# Altium footprint library IC_SMD_BGA.PCBLIB: 101 footprints (part 12 of 13)
Each footprint in its own frame and in the unit in brackets; x right, y up, seen from the top. Pads: shape width x height; smd on the part's side, far side on the other; paste and mask are expansions set on the pad; w line width, h text height; cw(c..) or ccw(c..) is an arc to the next point about the centre after c.
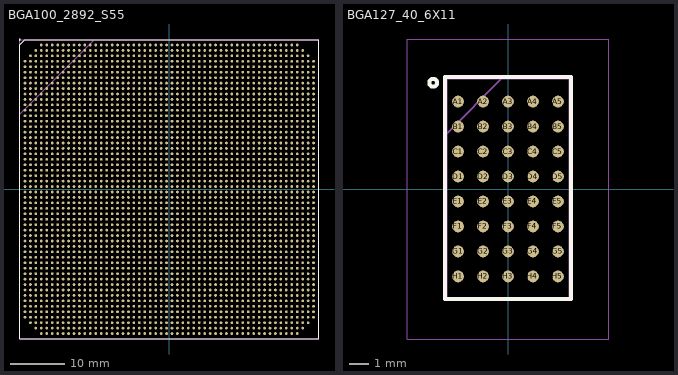
[diagram p11: the footprints below, top view; thin cyan lines are the x and y axes]

## BGA100_2892_S55 [mm] "BGA, 2892-Leads, Body 55x55mmx4.30mm, Pitch 1.00mm"
pads (2892):
  round 0.5 smd: A4(-23.5,26.5) A5(-22.5,26.5) A6(-21.5,26.5) A7(-20.5,26.5) A8(-19.5,26.5) A9(-18.5,26.5) A10(-17.5,26.5) A11(-16.5,26.5) A12(-15.5,26.5) A13(-14.5,26.5) A14(-13.5,26.5) A15(-12.5,26.5) A16(-11.5,26.5) A17(-10.5,26.5) A18(-9.5,26.5) A19(-8.5,26.5) A20(-7.5,26.5) A21(-6.5,26.5) A22(-5.5,26.5) A23(-4.5,26.5) A24(-3.5,26.5) A25(-2.5,26.5) A26(-1.5,26.5) A27(-0.5,26.5) A28(0.5,26.5) A29(1.5,26.5) A30(2.5,26.5) A31(3.5,26.5) A32(4.5,26.5) A33(5.5,26.5) A34(6.5,26.5) A35(7.5,26.5) A36(8.5,26.5) A37(9.5,26.5) A38(10.5,26.5) A39(11.5,26.5) A40(12.5,26.5) A41(13.5,26.5) A42(14.5,26.5) A43(15.5,26.5) A44(16.5,26.5) A45(17.5,26.5) A46(18.5,26.5) A47(19.5,26.5) A48(20.5,26.5) A49(21.5,26.5) A50(22.5,26.5) A51(23.5,26.5) AA1(-26.5,6.5) AA2(-25.5,6.5) AA3(-24.5,6.5) AA4(-23.5,6.5) AA5(-22.5,6.5) AA6(-21.5,6.5) AA7(-20.5,6.5) AA8(-19.5,6.5) AA9(-18.5,6.5) AA10(-17.5,6.5) AA11(-16.5,6.5) AA12(-15.5,6.5) AA13(-14.5,6.5) AA14(-13.5,6.5) AA15(-12.5,6.5) AA16(-11.5,6.5) AA17(-10.5,6.5) AA18(-9.5,6.5) AA19(-8.5,6.5) AA20(-7.5,6.5) AA21(-6.5,6.5) AA22(-5.5,6.5) AA23(-4.5,6.5) AA24(-3.5,6.5) AA25(-2.5,6.5) AA26(-1.5,6.5) AA27(-0.5,6.5) AA28(0.5,6.5) AA29(1.5,6.5) AA30(2.5,6.5) AA31(3.5,6.5) AA32(4.5,6.5) AA33(5.5,6.5) AA34(6.5,6.5) AA35(7.5,6.5) AA36(8.5,6.5) AA37(9.5,6.5) AA38(10.5,6.5) AA39(11.5,6.5) AA40(12.5,6.5) AA41(13.5,6.5) AA42(14.5,6.5) AA43(15.5,6.5) AA44(16.5,6.5) AA45(17.5,6.5) AA46(18.5,6.5) AA47(19.5,6.5) AA48(20.5,6.5) AA49(21.5,6.5) AA50(22.5,6.5) AA51(23.5,6.5) AA52(24.5,6.5) AA53(25.5,6.5) AA54(26.5,6.5) AB1(-26.5,5.5) AB2(-25.5,5.5) AB3(-24.5,5.5) AB4(-23.5,5.5) AB5(-22.5,5.5) AB6(-21.5,5.5) AB7(-20.5,5.5) AB8(-19.5,5.5) AB9(-18.5,5.5) AB10(-17.5,5.5) AB11(-16.5,5.5) AB12(-15.5,5.5) AB13(-14.5,5.5) AB14(-13.5,5.5) AB15(-12.5,5.5) AB16(-11.5,5.5) AB17(-10.5,5.5) AB18(-9.5,5.5) AB19(-8.5,5.5) AB20(-7.5,5.5) AB21(-6.5,5.5) AB22(-5.5,5.5) AB23(-4.5,5.5) AB24(-3.5,5.5) AB25(-2.5,5.5) AB26(-1.5,5.5) AB27(-0.5,5.5) AB28(0.5,5.5) AB29(1.5,5.5) AB30(2.5,5.5) AB31(3.5,5.5) AB32(4.5,5.5) AB33(5.5,5.5) AB34(6.5,5.5) AB35(7.5,5.5) AB36(8.5,5.5) AB37(9.5,5.5) AB38(10.5,5.5) AB39(11.5,5.5) AB40(12.5,5.5) AB41(13.5,5.5) AB42(14.5,5.5) AB43(15.5,5.5) AB44(16.5,5.5) AB45(17.5,5.5) AB46(18.5,5.5) AB47(19.5,5.5) AB48(20.5,5.5) AB49(21.5,5.5) AB50(22.5,5.5) AB51(23.5,5.5) AB52(24.5,5.5) AB53(25.5,5.5) AB54(26.5,5.5) AC1(-26.5,4.5) AC2(-25.5,4.5) AC3(-24.5,4.5) AC4(-23.5,4.5) AC5(-22.5,4.5) AC6(-21.5,4.5) AC7(-20.5,4.5) AC8(-19.5,4.5) AC9(-18.5,4.5) AC10(-17.5,4.5) AC11(-16.5,4.5) AC12(-15.5,4.5) AC13(-14.5,4.5) AC14(-13.5,4.5) AC15(-12.5,4.5) AC16(-11.5,4.5) AC17(-10.5,4.5) AC18(-9.5,4.5) AC19(-8.5,4.5) AC20(-7.5,4.5) AC21(-6.5,4.5) AC22(-5.5,4.5) AC23(-4.5,4.5) AC24(-3.5,4.5) AC25(-2.5,4.5) AC26(-1.5,4.5) AC27(-0.5,4.5) AC28(0.5,4.5) AC29(1.5,4.5) AC30(2.5,4.5) AC31(3.5,4.5) AC32(4.5,4.5) AC33(5.5,4.5) AC34(6.5,4.5) AC35(7.5,4.5) AC36(8.5,4.5) AC37(9.5,4.5) AC38(10.5,4.5) AC39(11.5,4.5) AC40(12.5,4.5) AC41(13.5,4.5) AC42(14.5,4.5) AC43(15.5,4.5) AC44(16.5,4.5) AC45(17.5,4.5) AC46(18.5,4.5) AC47(19.5,4.5) AC48(20.5,4.5) AC49(21.5,4.5) AC50(22.5,4.5) AC51(23.5,4.5) AC52(24.5,4.5) AC53(25.5,4.5) AC54(26.5,4.5) AD1(-26.5,3.5) AD2(-25.5,3.5) AD3(-24.5,3.5) AD4(-23.5,3.5) AD5(-22.5,3.5) AD6(-21.5,3.5) AD7(-20.5,3.5) AD8(-19.5,3.5) AD9(-18.5,3.5) AD10(-17.5,3.5) AD11(-16.5,3.5) AD12(-15.5,3.5) AD13(-14.5,3.5) AD14(-13.5,3.5) AD15(-12.5,3.5) AD16(-11.5,3.5) AD17(-10.5,3.5) AD18(-9.5,3.5) AD19(-8.5,3.5) AD20(-7.5,3.5) AD21(-6.5,3.5) AD22(-5.5,3.5) AD23(-4.5,3.5) AD24(-3.5,3.5) AD25(-2.5,3.5) AD26(-1.5,3.5) AD27(-0.5,3.5) AD28(0.5,3.5) AD29(1.5,3.5) AD30(2.5,3.5) AD31(3.5,3.5) AD32(4.5,3.5) AD33(5.5,3.5) AD34(6.5,3.5) AD35(7.5,3.5) AD36(8.5,3.5) AD37(9.5,3.5) AD38(10.5,3.5) AD39(11.5,3.5) AD40(12.5,3.5) AD41(13.5,3.5) AD42(14.5,3.5) AD43(15.5,3.5) AD44(16.5,3.5) AD45(17.5,3.5) AD46(18.5,3.5) AD47(19.5,3.5) AD48(20.5,3.5) AD49(21.5,3.5) AD50(22.5,3.5) AD51(23.5,3.5) AD52(24.5,3.5) AD53(25.5,3.5) AD54(26.5,3.5) AE1(-26.5,2.5) AE2(-25.5,2.5) AE3(-24.5,2.5) AE4(-23.5,2.5) AE5(-22.5,2.5) AE6(-21.5,2.5) AE7(-20.5,2.5) AE8(-19.5,2.5) AE9(-18.5,2.5) AE10(-17.5,2.5) AE11(-16.5,2.5) AE12(-15.5,2.5) AE13(-14.5,2.5) AE14(-13.5,2.5) AE15(-12.5,2.5) AE16(-11.5,2.5) AE17(-10.5,2.5) AE18(-9.5,2.5) AE19(-8.5,2.5) AE20(-7.5,2.5) AE21(-6.5,2.5) AE22(-5.5,2.5) AE23(-4.5,2.5) AE24(-3.5,2.5) AE25(-2.5,2.5) AE26(-1.5,2.5) AE27(-0.5,2.5) AE28(0.5,2.5) AE29(1.5,2.5) AE30(2.5,2.5) AE31(3.5,2.5) AE32(4.5,2.5) AE33(5.5,2.5) AE34(6.5,2.5) AE35(7.5,2.5) AE36(8.5,2.5) AE37(9.5,2.5) AE38(10.5,2.5) AE39(11.5,2.5) AE40(12.5,2.5) AE41(13.5,2.5) AE42(14.5,2.5) AE43(15.5,2.5) AE44(16.5,2.5) AE45(17.5,2.5) AE46(18.5,2.5) AE47(19.5,2.5) AE48(20.5,2.5) AE49(21.5,2.5) AE50(22.5,2.5) AE51(23.5,2.5) AE52(24.5,2.5) AE53(25.5,2.5) AE54(26.5,2.5) AF1(-26.5,1.5) AF2(-25.5,1.5) AF3(-24.5,1.5) AF4(-23.5,1.5) AF5(-22.5,1.5) AF6(-21.5,1.5) AF7(-20.5,1.5) AF8(-19.5,1.5) AF9(-18.5,1.5) AF10(-17.5,1.5) AF11(-16.5,1.5) AF12(-15.5,1.5) AF13(-14.5,1.5) AF14(-13.5,1.5) AF15(-12.5,1.5) AF16(-11.5,1.5) AF17(-10.5,1.5) AF18(-9.5,1.5) AF19(-8.5,1.5) AF20(-7.5,1.5) AF21(-6.5,1.5) AF22(-5.5,1.5) AF23(-4.5,1.5) AF24(-3.5,1.5) AF25(-2.5,1.5) AF26(-1.5,1.5) AF27(-0.5,1.5) AF28(0.5,1.5) AF29(1.5,1.5) AF30(2.5,1.5) AF31(3.5,1.5) AF32(4.5,1.5) AF33(5.5,1.5) AF34(6.5,1.5) AF35(7.5,1.5) AF36(8.5,1.5) AF37(9.5,1.5) AF38(10.5,1.5) AF39(11.5,1.5) AF40(12.5,1.5) AF41(13.5,1.5) AF42(14.5,1.5) AF43(15.5,1.5) AF44(16.5,1.5) AF45(17.5,1.5) AF46(18.5,1.5) AF47(19.5,1.5) AF48(20.5,1.5) AF49(21.5,1.5) AF50(22.5,1.5) AF51(23.5,1.5) AF52(24.5,1.5) AF53(25.5,1.5) AF54(26.5,1.5) AG1(-26.5,0.5) AG2(-25.5,0.5) AG3(-24.5,0.5) AG4(-23.5,0.5) AG5(-22.5,0.5) AG6(-21.5,0.5) AG7(-20.5,0.5) AG8(-19.5,0.5) AG9(-18.5,0.5) AG10(-17.5,0.5) AG11(-16.5,0.5) AG12(-15.5,0.5) AG13(-14.5,0.5) AG14(-13.5,0.5) AG15(-12.5,0.5) AG16(-11.5,0.5) AG17(-10.5,0.5) AG18(-9.5,0.5) AG19(-8.5,0.5) AG20(-7.5,0.5) AG21(-6.5,0.5) AG22(-5.5,0.5) AG23(-4.5,0.5) AG24(-3.5,0.5) AG25(-2.5,0.5) AG26(-1.5,0.5) AG27(-0.5,0.5) AG28(0.5,0.5) AG29(1.5,0.5) AG30(2.5,0.5) AG31(3.5,0.5) AG32(4.5,0.5) AG33(5.5,0.5) AG34(6.5,0.5) AG35(7.5,0.5) AG36(8.5,0.5) AG37(9.5,0.5) AG38(10.5,0.5) AG39(11.5,0.5) AG40(12.5,0.5) AG41(13.5,0.5) AG42(14.5,0.5) AG43(15.5,0.5) AG44(16.5,0.5) AG45(17.5,0.5) AG46(18.5,0.5) AG47(19.5,0.5) AG48(20.5,0.5) AG49(21.5,0.5) AG50(22.5,0.5) AG51(23.5,0.5) AG52(24.5,0.5) AG53(25.5,0.5) AG54(26.5,0.5) AH1(-26.5,-0.5) AH2(-25.5,-0.5) AH3(-24.5,-0.5) AH4(-23.5,-0.5) AH5(-22.5,-0.5) AH6(-21.5,-0.5) AH7(-20.5,-0.5) AH8(-19.5,-0.5) AH9(-18.5,-0.5) AH10(-17.5,-0.5) AH11(-16.5,-0.5) AH12(-15.5,-0.5) AH13(-14.5,-0.5) AH14(-13.5,-0.5) AH15(-12.5,-0.5) AH16(-11.5,-0.5) AH17(-10.5,-0.5) AH18(-9.5,-0.5) AH19(-8.5,-0.5) AH20(-7.5,-0.5) AH21(-6.5,-0.5) AH22(-5.5,-0.5) AH23(-4.5,-0.5) AH24(-3.5,-0.5) AH25(-2.5,-0.5) AH26(-1.5,-0.5) AH27(-0.5,-0.5) AH28(0.5,-0.5) AH29(1.5,-0.5) AH30(2.5,-0.5) AH31(3.5,-0.5) AH32(4.5,-0.5) AH33(5.5,-0.5) AH34(6.5,-0.5) AH35(7.5,-0.5) AH36(8.5,-0.5) AH37(9.5,-0.5) AH38(10.5,-0.5) AH39(11.5,-0.5) AH40(12.5,-0.5) AH41(13.5,-0.5) AH42(14.5,-0.5) AH43(15.5,-0.5) AH44(16.5,-0.5) AH45(17.5,-0.5) AH46(18.5,-0.5) AH47(19.5,-0.5) AH48(20.5,-0.5) AH49(21.5,-0.5) AH50(22.5,-0.5) AH51(23.5,-0.5) AH52(24.5,-0.5) AH53(25.5,-0.5) AH54(26.5,-0.5) AJ1(-26.5,-1.5) AJ2(-25.5,-1.5) AJ3(-24.5,-1.5) AJ4(-23.5,-1.5) AJ5(-22.5,-1.5) AJ6(-21.5,-1.5) AJ7(-20.5,-1.5) AJ8(-19.5,-1.5) AJ9(-18.5,-1.5) AJ10(-17.5,-1.5) AJ11(-16.5,-1.5) AJ12(-15.5,-1.5) AJ13(-14.5,-1.5) AJ14(-13.5,-1.5) AJ15(-12.5,-1.5) AJ16(-11.5,-1.5) AJ17(-10.5,-1.5) AJ18(-9.5,-1.5) AJ19(-8.5,-1.5) AJ20(-7.5,-1.5) AJ21(-6.5,-1.5) AJ22(-5.5,-1.5) AJ23(-4.5,-1.5) AJ24(-3.5,-1.5) AJ25(-2.5,-1.5) AJ26(-1.5,-1.5) AJ27(-0.5,-1.5) AJ28(0.5,-1.5) AJ29(1.5,-1.5) AJ30(2.5,-1.5) AJ31(3.5,-1.5) AJ32(4.5,-1.5) AJ33(5.5,-1.5) AJ34(6.5,-1.5) AJ35(7.5,-1.5) AJ36(8.5,-1.5) AJ37(9.5,-1.5) AJ38(10.5,-1.5) AJ39(11.5,-1.5) AJ40(12.5,-1.5) AJ41(13.5,-1.5) AJ42(14.5,-1.5) AJ43(15.5,-1.5) AJ44(16.5,-1.5) AJ45(17.5,-1.5) AJ46(18.5,-1.5) AJ47(19.5,-1.5) AJ48(20.5,-1.5) AJ49(21.5,-1.5) AJ50(22.5,-1.5) AJ51(23.5,-1.5) AJ52(24.5,-1.5) AJ53(25.5,-1.5) AJ54(26.5,-1.5) AK1(-26.5,-2.5) AK2(-25.5,-2.5) AK3(-24.5,-2.5) AK4(-23.5,-2.5) AK5(-22.5,-2.5) AK6(-21.5,-2.5) AK7(-20.5,-2.5) AK8(-19.5,-2.5) AK9(-18.5,-2.5) AK10(-17.5,-2.5) AK11(-16.5,-2.5) AK12(-15.5,-2.5) AK13(-14.5,-2.5) AK14(-13.5,-2.5) AK15(-12.5,-2.5) AK16(-11.5,-2.5) AK17(-10.5,-2.5) AK18(-9.5,-2.5) AK19(-8.5,-2.5) AK20(-7.5,-2.5) AK21(-6.5,-2.5) AK22(-5.5,-2.5) AK23(-4.5,-2.5) AK24(-3.5,-2.5) AK25(-2.5,-2.5) AK26(-1.5,-2.5) AK27(-0.5,-2.5) AK28(0.5,-2.5) AK29(1.5,-2.5) AK30(2.5,-2.5) AK31(3.5,-2.5) AK32(4.5,-2.5) AK33(5.5,-2.5) AK34(6.5,-2.5) AK35(7.5,-2.5) AK36(8.5,-2.5) AK37(9.5,-2.5) AK38(10.5,-2.5) AK39(11.5,-2.5) AK40(12.5,-2.5) AK41(13.5,-2.5) AK42(14.5,-2.5) AK43(15.5,-2.5) AK44(16.5,-2.5) AK45(17.5,-2.5) AK46(18.5,-2.5) AK47(19.5,-2.5) AK48(20.5,-2.5) AK49(21.5,-2.5) AK50(22.5,-2.5) AK51(23.5,-2.5) AK52(24.5,-2.5) AK53(25.5,-2.5) AK54(26.5,-2.5) AL1(-26.5,-3.5) AL2(-25.5,-3.5) AL3(-24.5,-3.5) AL4(-23.5,-3.5) AL5(-22.5,-3.5) AL6(-21.5,-3.5) AL7(-20.5,-3.5) AL8(-19.5,-3.5) AL9(-18.5,-3.5) AL10(-17.5,-3.5) AL11(-16.5,-3.5) AL12(-15.5,-3.5) AL13(-14.5,-3.5) AL14(-13.5,-3.5) AL15(-12.5,-3.5) AL16(-11.5,-3.5) AL17(-10.5,-3.5) AL18(-9.5,-3.5) AL19(-8.5,-3.5) AL20(-7.5,-3.5) AL21(-6.5,-3.5) AL22(-5.5,-3.5) AL23(-4.5,-3.5) AL24(-3.5,-3.5) AL25(-2.5,-3.5) AL26(-1.5,-3.5) AL27(-0.5,-3.5) AL28(0.5,-3.5) AL29(1.5,-3.5) AL30(2.5,-3.5) AL31(3.5,-3.5) AL32(4.5,-3.5) AL33(5.5,-3.5) AL34(6.5,-3.5) AL35(7.5,-3.5) AL36(8.5,-3.5) AL37(9.5,-3.5) AL38(10.5,-3.5) AL39(11.5,-3.5) AL40(12.5,-3.5) AL41(13.5,-3.5) AL42(14.5,-3.5) AL43(15.5,-3.5) AL44(16.5,-3.5) AL45(17.5,-3.5) AL46(18.5,-3.5) AL47(19.5,-3.5) AL48(20.5,-3.5) AL49(21.5,-3.5) AL50(22.5,-3.5) AL51(23.5,-3.5) AL52(24.5,-3.5) AL53(25.5,-3.5) AL54(26.5,-3.5) AM1(-26.5,-4.5) AM2(-25.5,-4.5) AM3(-24.5,-4.5) AM4(-23.5,-4.5) AM5(-22.5,-4.5) AM6(-21.5,-4.5) AM7(-20.5,-4.5) AM8(-19.5,-4.5) AM9(-18.5,-4.5) AM10(-17.5,-4.5) AM11(-16.5,-4.5) AM12(-15.5,-4.5) AM13(-14.5,-4.5) AM14(-13.5,-4.5) AM15(-12.5,-4.5) AM16(-11.5,-4.5) AM17(-10.5,-4.5) AM18(-9.5,-4.5) AM19(-8.5,-4.5) AM20(-7.5,-4.5) AM21(-6.5,-4.5) AM22(-5.5,-4.5) AM23(-4.5,-4.5) AM24(-3.5,-4.5) AM25(-2.5,-4.5) AM26(-1.5,-4.5) AM27(-0.5,-4.5) AM28(0.5,-4.5) AM29(1.5,-4.5) AM30(2.5,-4.5) AM31(3.5,-4.5) AM32(4.5,-4.5) AM33(5.5,-4.5) AM34(6.5,-4.5) AM35(7.5,-4.5) AM36(8.5,-4.5) AM37(9.5,-4.5) AM38(10.5,-4.5) AM39(11.5,-4.5) AM40(12.5,-4.5) AM41(13.5,-4.5) AM42(14.5,-4.5) AM43(15.5,-4.5) AM44(16.5,-4.5) AM45(17.5,-4.5) AM46(18.5,-4.5) AM47(19.5,-4.5) AM48(20.5,-4.5) AM49(21.5,-4.5) AM50(22.5,-4.5) AM51(23.5,-4.5) AM52(24.5,-4.5) AM53(25.5,-4.5) AM54(26.5,-4.5) AN1(-26.5,-5.5) AN2(-25.5,-5.5) AN3(-24.5,-5.5) AN4(-23.5,-5.5) AN5(-22.5,-5.5) AN6(-21.5,-5.5) AN7(-20.5,-5.5) AN8(-19.5,-5.5) AN9(-18.5,-5.5) AN10(-17.5,-5.5) AN11(-16.5,-5.5) AN12(-15.5,-5.5) AN13(-14.5,-5.5) AN14(-13.5,-5.5) AN15(-12.5,-5.5) AN16(-11.5,-5.5) AN17(-10.5,-5.5) AN18(-9.5,-5.5) AN19(-8.5,-5.5) AN20(-7.5,-5.5) AN21(-6.5,-5.5) AN22(-5.5,-5.5) AN23(-4.5,-5.5) AN24(-3.5,-5.5) AN25(-2.5,-5.5) AN26(-1.5,-5.5) AN27(-0.5,-5.5) AN28(0.5,-5.5) AN29(1.5,-5.5) AN30(2.5,-5.5) AN31(3.5,-5.5) AN32(4.5,-5.5) AN33(5.5,-5.5) AN34(6.5,-5.5) AN35(7.5,-5.5) AN36(8.5,-5.5) AN37(9.5,-5.5) AN38(10.5,-5.5) AN39(11.5,-5.5) AN40(12.5,-5.5) AN41(13.5,-5.5) AN42(14.5,-5.5) AN43(15.5,-5.5) AN44(16.5,-5.5) AN45(17.5,-5.5) AN46(18.5,-5.5) AN47(19.5,-5.5) AN48(20.5,-5.5) AN49(21.5,-5.5) AN50(22.5,-5.5) AN51(23.5,-5.5) AN52(24.5,-5.5) AN53(25.5,-5.5) AN54(26.5,-5.5) AP1(-26.5,-6.5) AP2(-25.5,-6.5) AP3(-24.5,-6.5) AP4(-23.5,-6.5) AP5(-22.5,-6.5) AP6(-21.5,-6.5) AP7(-20.5,-6.5) AP8(-19.5,-6.5) AP9(-18.5,-6.5) AP10(-17.5,-6.5) AP11(-16.5,-6.5) AP12(-15.5,-6.5) AP13(-14.5,-6.5) AP14(-13.5,-6.5) AP15(-12.5,-6.5) AP16(-11.5,-6.5) AP17(-10.5,-6.5) AP18(-9.5,-6.5) AP19(-8.5,-6.5) AP20(-7.5,-6.5) AP21(-6.5,-6.5) AP22(-5.5,-6.5) AP23(-4.5,-6.5) AP24(-3.5,-6.5) AP25(-2.5,-6.5) AP26(-1.5,-6.5) AP27(-0.5,-6.5) AP28(0.5,-6.5) AP29(1.5,-6.5) AP30(2.5,-6.5) AP31(3.5,-6.5) AP32(4.5,-6.5) AP33(5.5,-6.5) AP34(6.5,-6.5) AP35(7.5,-6.5) AP36(8.5,-6.5) AP37(9.5,-6.5) AP38(10.5,-6.5) AP39(11.5,-6.5) AP40(12.5,-6.5) AP41(13.5,-6.5) AP42(14.5,-6.5) AP43(15.5,-6.5) AP44(16.5,-6.5) AP45(17.5,-6.5) AP46(18.5,-6.5) AP47(19.5,-6.5) AP48(20.5,-6.5) AP49(21.5,-6.5) AP50(22.5,-6.5) AP51(23.5,-6.5) AP52(24.5,-6.5) AP53(25.5,-6.5) AP54(26.5,-6.5) AR1(-26.5,-7.5) AR2(-25.5,-7.5) AR3(-24.5,-7.5) AR4(-23.5,-7.5) AR5(-22.5,-7.5) AR6(-21.5,-7.5) AR7(-20.5,-7.5) AR8(-19.5,-7.5) AR9(-18.5,-7.5) AR10(-17.5,-7.5) AR11(-16.5,-7.5) AR12(-15.5,-7.5) AR13(-14.5,-7.5) AR14(-13.5,-7.5) AR15(-12.5,-7.5) AR16(-11.5,-7.5) AR17(-10.5,-7.5) AR18(-9.5,-7.5) AR19(-8.5,-7.5) AR20(-7.5,-7.5) AR21(-6.5,-7.5) AR22(-5.5,-7.5) AR23(-4.5,-7.5) AR24(-3.5,-7.5) AR25(-2.5,-7.5) AR26(-1.5,-7.5) AR27(-0.5,-7.5) AR28(0.5,-7.5) AR29(1.5,-7.5) AR30(2.5,-7.5) AR31(3.5,-7.5) AR32(4.5,-7.5) AR33(5.5,-7.5) AR34(6.5,-7.5) AR35(7.5,-7.5) AR36(8.5,-7.5) AR37(9.5,-7.5) AR38(10.5,-7.5) AR39(11.5,-7.5) AR40(12.5,-7.5) AR41(13.5,-7.5) AR42(14.5,-7.5) AR43(15.5,-7.5) AR44(16.5,-7.5) AR45(17.5,-7.5) AR46(18.5,-7.5) AR47(19.5,-7.5) AR48(20.5,-7.5) AR49(21.5,-7.5) AR50(22.5,-7.5) AR51(23.5,-7.5) AR52(24.5,-7.5) AR53(25.5,-7.5) AR54(26.5,-7.5) AT1(-26.5,-8.5) AT2(-25.5,-8.5) AT3(-24.5,-8.5) AT4(-23.5,-8.5) AT5(-22.5,-8.5) AT6(-21.5,-8.5) AT7(-20.5,-8.5) AT8(-19.5,-8.5) AT9(-18.5,-8.5) AT10(-17.5,-8.5) AT11(-16.5,-8.5) AT12(-15.5,-8.5) AT13(-14.5,-8.5) AT14(-13.5,-8.5) AT15(-12.5,-8.5) AT16(-11.5,-8.5) AT17(-10.5,-8.5) AT18(-9.5,-8.5) AT19(-8.5,-8.5) AT20(-7.5,-8.5) AT21(-6.5,-8.5) AT22(-5.5,-8.5) AT23(-4.5,-8.5) AT24(-3.5,-8.5) AT25(-2.5,-8.5) AT26(-1.5,-8.5) AT27(-0.5,-8.5) AT28(0.5,-8.5) AT29(1.5,-8.5) AT30(2.5,-8.5) AT31(3.5,-8.5) AT32(4.5,-8.5) AT33(5.5,-8.5) AT34(6.5,-8.5) AT35(7.5,-8.5) AT36(8.5,-8.5) AT37(9.5,-8.5) AT38(10.5,-8.5) AT39(11.5,-8.5) AT40(12.5,-8.5) AT41(13.5,-8.5) AT42(14.5,-8.5) AT43(15.5,-8.5) AT44(16.5,-8.5) AT45(17.5,-8.5) AT46(18.5,-8.5) AT47(19.5,-8.5) AT48(20.5,-8.5) AT49(21.5,-8.5) AT50(22.5,-8.5) AT51(23.5,-8.5) AT52(24.5,-8.5) AT53(25.5,-8.5) AT54(26.5,-8.5) AU1(-26.5,-9.5) AU2(-25.5,-9.5) AU3(-24.5,-9.5) AU4(-23.5,-9.5) AU5(-22.5,-9.5) AU6(-21.5,-9.5) AU7(-20.5,-9.5) AU8(-19.5,-9.5) AU9(-18.5,-9.5) AU10(-17.5,-9.5) AU11(-16.5,-9.5) AU12(-15.5,-9.5) AU13(-14.5,-9.5) AU14(-13.5,-9.5) AU15(-12.5,-9.5) AU16(-11.5,-9.5) AU17(-10.5,-9.5) AU18(-9.5,-9.5) AU19(-8.5,-9.5) AU20(-7.5,-9.5) AU21(-6.5,-9.5) AU22(-5.5,-9.5) AU23(-4.5,-9.5) AU24(-3.5,-9.5) AU25(-2.5,-9.5) AU26(-1.5,-9.5) AU27(-0.5,-9.5) AU28(0.5,-9.5) AU29(1.5,-9.5) AU30(2.5,-9.5) AU31(3.5,-9.5) AU32(4.5,-9.5) AU33(5.5,-9.5) AU34(6.5,-9.5) AU35(7.5,-9.5) AU36(8.5,-9.5) AU37(9.5,-9.5) AU38(10.5,-9.5) AU39(11.5,-9.5) AU40(12.5,-9.5) AU41(13.5,-9.5) AU42(14.5,-9.5) AU43(15.5,-9.5) AU44(16.5,-9.5) AU45(17.5,-9.5) AU46(18.5,-9.5) AU47(19.5,-9.5) AU48(20.5,-9.5) AU49(21.5,-9.5) AU50(22.5,-9.5) AU51(23.5,-9.5) AU52(24.5,-9.5) AU53(25.5,-9.5) AU54(26.5,-9.5) AV1(-26.5,-10.5) AV2(-25.5,-10.5) AV3(-24.5,-10.5) AV4(-23.5,-10.5) AV5(-22.5,-10.5) AV6(-21.5,-10.5) AV7(-20.5,-10.5) AV8(-19.5,-10.5) AV9(-18.5,-10.5) AV10(-17.5,-10.5) AV11(-16.5,-10.5) AV12(-15.5,-10.5) AV13(-14.5,-10.5) AV14(-13.5,-10.5) AV15(-12.5,-10.5) AV16(-11.5,-10.5) AV17(-10.5,-10.5) AV18(-9.5,-10.5) AV19(-8.5,-10.5) AV20(-7.5,-10.5) AV21(-6.5,-10.5) AV22(-5.5,-10.5) AV23(-4.5,-10.5) AV24(-3.5,-10.5) AV25(-2.5,-10.5) AV26(-1.5,-10.5) AV27(-0.5,-10.5) AV28(0.5,-10.5) AV29(1.5,-10.5) AV30(2.5,-10.5) AV31(3.5,-10.5) AV32(4.5,-10.5) AV33(5.5,-10.5) AV34(6.5,-10.5) AV35(7.5,-10.5) AV36(8.5,-10.5) AV37(9.5,-10.5) AV38(10.5,-10.5) AV39(11.5,-10.5) AV40(12.5,-10.5) AV41(13.5,-10.5) AV42(14.5,-10.5) AV43(15.5,-10.5) AV44(16.5,-10.5) AV45(17.5,-10.5) AV46(18.5,-10.5) AV47(19.5,-10.5) AV48(20.5,-10.5) AV49(21.5,-10.5) AV50(22.5,-10.5) AV51(23.5,-10.5) AV52(24.5,-10.5) AV53(25.5,-10.5) AV54(26.5,-10.5) AW1(-26.5,-11.5) AW2(-25.5,-11.5) AW3(-24.5,-11.5) AW4(-23.5,-11.5) AW5(-22.5,-11.5) AW6(-21.5,-11.5) AW7(-20.5,-11.5) AW8(-19.5,-11.5) AW9(-18.5,-11.5) AW10(-17.5,-11.5) AW11(-16.5,-11.5) AW12(-15.5,-11.5) AW13(-14.5,-11.5) AW14(-13.5,-11.5) AW15(-12.5,-11.5) AW16(-11.5,-11.5) AW17(-10.5,-11.5) AW18(-9.5,-11.5) AW19(-8.5,-11.5) AW20(-7.5,-11.5) AW21(-6.5,-11.5) AW22(-5.5,-11.5) AW23(-4.5,-11.5) AW24(-3.5,-11.5) AW25(-2.5,-11.5) AW26(-1.5,-11.5) AW27(-0.5,-11.5) AW28(0.5,-11.5) AW29(1.5,-11.5) AW30(2.5,-11.5) AW31(3.5,-11.5) AW32(4.5,-11.5) AW33(5.5,-11.5) AW34(6.5,-11.5) AW35(7.5,-11.5) AW36(8.5,-11.5) AW37(9.5,-11.5) AW38(10.5,-11.5) AW39(11.5,-11.5) AW40(12.5,-11.5) AW41(13.5,-11.5) AW42(14.5,-11.5) AW43(15.5,-11.5) AW44(16.5,-11.5) AW45(17.5,-11.5) AW46(18.5,-11.5) AW47(19.5,-11.5) AW48(20.5,-11.5) AW49(21.5,-11.5) AW50(22.5,-11.5) AW51(23.5,-11.5) AW52(24.5,-11.5) AW53(25.5,-11.5) AW54(26.5,-11.5) AY1(-26.5,-12.5) AY2(-25.5,-12.5) AY3(-24.5,-12.5) AY4(-23.5,-12.5) AY5(-22.5,-12.5) AY6(-21.5,-12.5) AY7(-20.5,-12.5) AY8(-19.5,-12.5) AY9(-18.5,-12.5) AY10(-17.5,-12.5) AY11(-16.5,-12.5) AY12(-15.5,-12.5) AY13(-14.5,-12.5) AY14(-13.5,-12.5) AY15(-12.5,-12.5) AY16(-11.5,-12.5) AY17(-10.5,-12.5) AY18(-9.5,-12.5) AY19(-8.5,-12.5) AY20(-7.5,-12.5) AY21(-6.5,-12.5) AY22(-5.5,-12.5) AY23(-4.5,-12.5) AY24(-3.5,-12.5) AY25(-2.5,-12.5) AY26(-1.5,-12.5) AY27(-0.5,-12.5) AY28(0.5,-12.5) AY29(1.5,-12.5) AY30(2.5,-12.5) AY31(3.5,-12.5) AY32(4.5,-12.5) AY33(5.5,-12.5) AY34(6.5,-12.5) AY35(7.5,-12.5) AY36(8.5,-12.5) AY37(9.5,-12.5) AY38(10.5,-12.5) AY39(11.5,-12.5) AY40(12.5,-12.5) AY41(13.5,-12.5) AY42(14.5,-12.5) AY43(15.5,-12.5) AY44(16.5,-12.5) AY45(17.5,-12.5) AY46(18.5,-12.5) AY47(19.5,-12.5) AY48(20.5,-12.5) AY49(21.5,-12.5) AY50(22.5,-12.5) AY51(23.5,-12.5) AY52(24.5,-12.5) AY53(25.5,-12.5) AY54(26.5,-12.5) B3(-24.5,25.5) B4(-23.5,25.5) B5(-22.5,25.5) B6(-21.5,25.5) B7(-20.5,25.5) B8(-19.5,25.5) B9(-18.5,25.5) B10(-17.5,25.5) B11(-16.5,25.5) B12(-15.5,25.5) B13(-14.5,25.5) B14(-13.5,25.5) B15(-12.5,25.5) B16(-11.5,25.5) B17(-10.5,25.5) B18(-9.5,25.5) B19(-8.5,25.5) B20(-7.5,25.5) B21(-6.5,25.5) B22(-5.5,25.5) B23(-4.5,25.5) B24(-3.5,25.5) B25(-2.5,25.5) B26(-1.5,25.5) B27(-0.5,25.5) B28(0.5,25.5) B29(1.5,25.5) B30(2.5,25.5) B31(3.5,25.5) B32(4.5,25.5) B33(5.5,25.5) B34(6.5,25.5) B35(7.5,25.5) B36(8.5,25.5) B37(9.5,25.5) B38(10.5,25.5) B39(11.5,25.5) B40(12.5,25.5) B41(13.5,25.5) B42(14.5,25.5) B43(15.5,25.5) B44(16.5,25.5) B45(17.5,25.5) B46(18.5,25.5) B47(19.5,25.5) B48(20.5,25.5) B49(21.5,25.5) B50(22.5,25.5) B51(23.5,25.5) B52(24.5,25.5) BA1(-26.5,-13.5) BA2(-25.5,-13.5) BA3(-24.5,-13.5) BA4(-23.5,-13.5) BA5(-22.5,-13.5) BA6(-21.5,-13.5) BA7(-20.5,-13.5) BA8(-19.5,-13.5) BA9(-18.5,-13.5) BA10(-17.5,-13.5) BA11(-16.5,-13.5) BA12(-15.5,-13.5) BA13(-14.5,-13.5) BA14(-13.5,-13.5) BA15(-12.5,-13.5) BA16(-11.5,-13.5) BA17(-10.5,-13.5) BA18(-9.5,-13.5) BA19(-8.5,-13.5) BA20(-7.5,-13.5) BA21(-6.5,-13.5) BA22(-5.5,-13.5) BA23(-4.5,-13.5) BA24(-3.5,-13.5) BA25(-2.5,-13.5) BA26(-1.5,-13.5) BA27(-0.5,-13.5) BA28(0.5,-13.5) BA29(1.5,-13.5) BA30(2.5,-13.5) BA31(3.5,-13.5) BA32(4.5,-13.5) BA33(5.5,-13.5) BA34(6.5,-13.5) BA35(7.5,-13.5) BA36(8.5,-13.5) BA37(9.5,-13.5) BA38(10.5,-13.5) BA39(11.5,-13.5) BA40(12.5,-13.5) BA41(13.5,-13.5) BA42(14.5,-13.5) BA43(15.5,-13.5) BA44(16.5,-13.5) BA45(17.5,-13.5) BA46(18.5,-13.5) BA47(19.5,-13.5) BA48(20.5,-13.5) BA49(21.5,-13.5) BA50(22.5,-13.5) BA51(23.5,-13.5) BA52(24.5,-13.5) BA53(25.5,-13.5) BA54(26.5,-13.5) BB1(-26.5,-14.5) BB2(-25.5,-14.5) BB3(-24.5,-14.5) BB4(-23.5,-14.5) BB5(-22.5,-14.5) BB6(-21.5,-14.5) BB7(-20.5,-14.5) BB8(-19.5,-14.5) BB9(-18.5,-14.5) BB10(-17.5,-14.5) BB11(-16.5,-14.5) BB12(-15.5,-14.5) BB13(-14.5,-14.5) BB14(-13.5,-14.5) BB15(-12.5,-14.5) BB16(-11.5,-14.5) BB17(-10.5,-14.5) BB18(-9.5,-14.5) BB19(-8.5,-14.5) BB20(-7.5,-14.5) BB21(-6.5,-14.5) BB22(-5.5,-14.5) BB23(-4.5,-14.5) BB24(-3.5,-14.5) BB25(-2.5,-14.5) BB26(-1.5,-14.5) BB27(-0.5,-14.5) BB28(0.5,-14.5) BB29(1.5,-14.5) BB30(2.5,-14.5) BB31(3.5,-14.5) BB32(4.5,-14.5) BB33(5.5,-14.5) BB34(6.5,-14.5) 